# Altium footprint library Footprints.PcbLib: 135 footprints (part 3 of 9)
Each footprint in its own frame and in the unit in brackets; x right, y up, seen from the top. Pads: shape width x height; smd on the part's side, far side on the other; paste and mask are expansions set on the pad; w line width, h text height; cw(c..) or ccw(c..) is an arc to the next point about the centre after c.
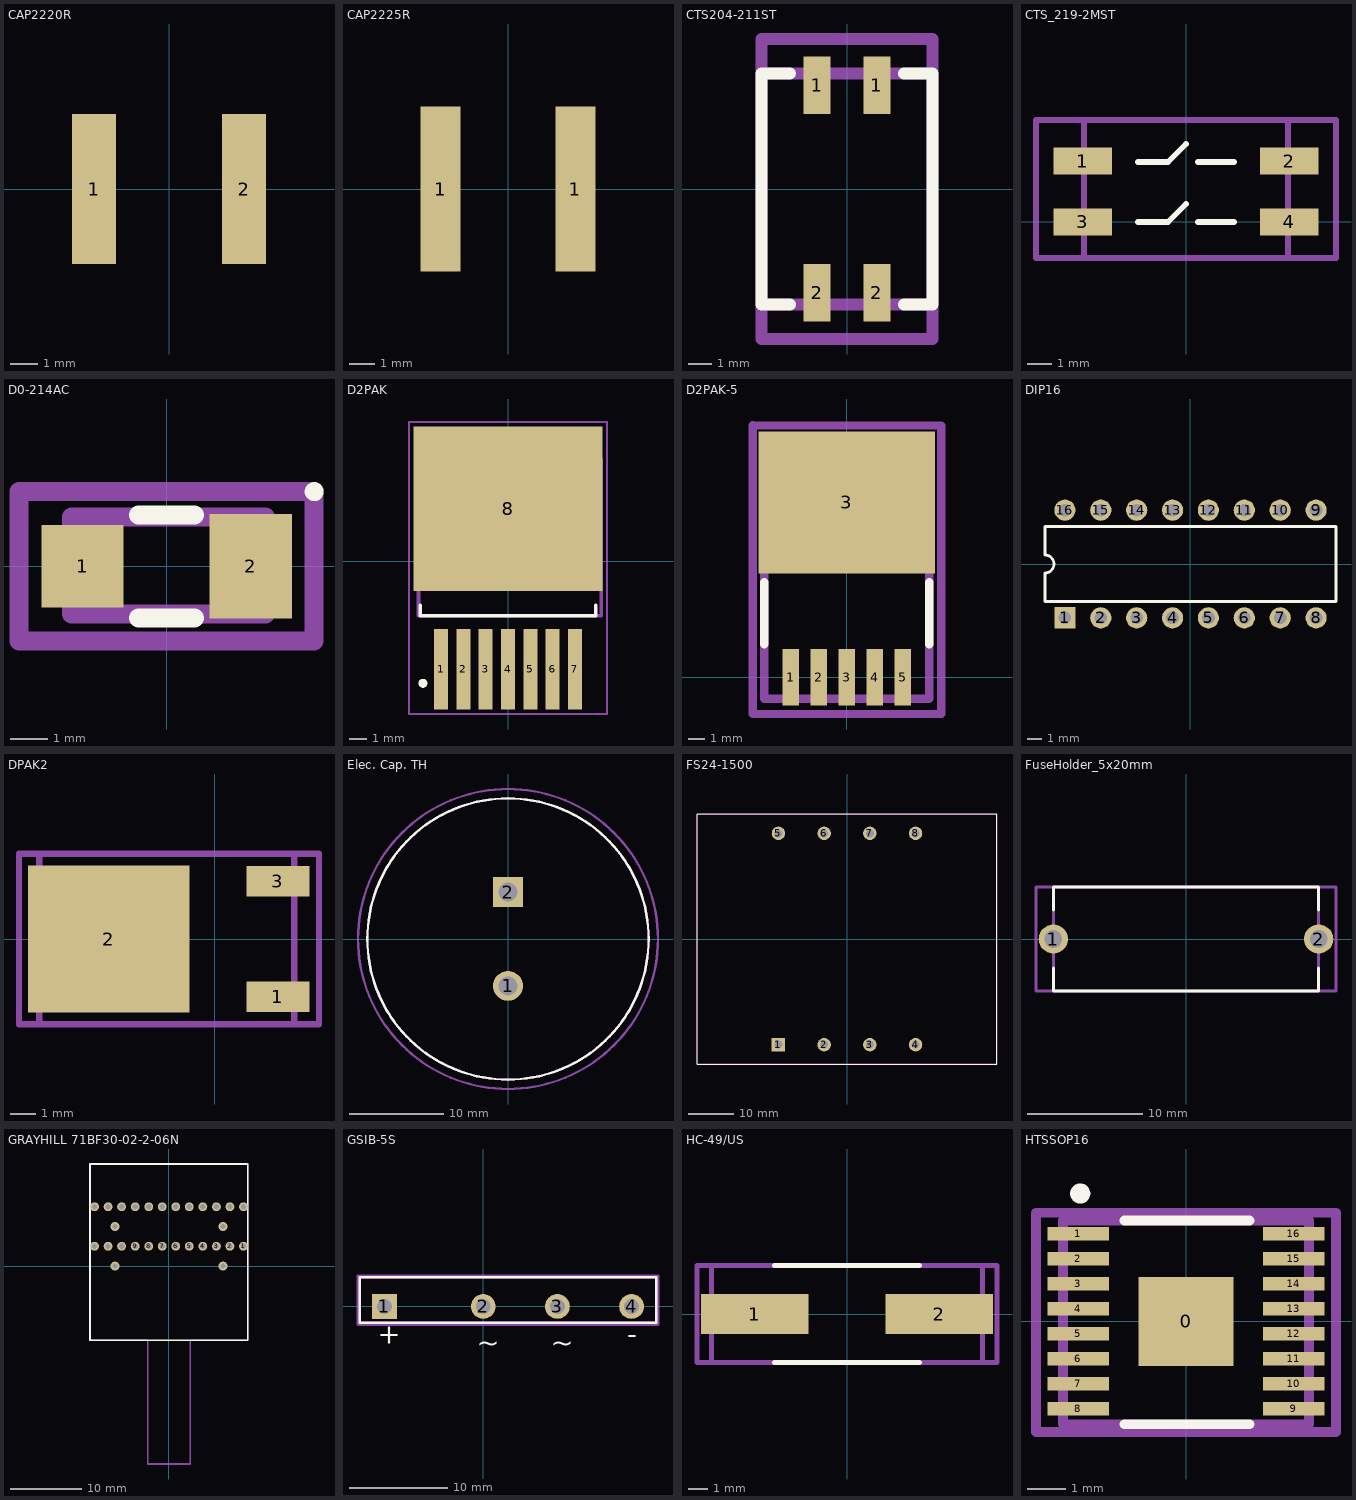
[diagram p2: the footprints below, top view; thin cyan lines are the x and y axes]

## CAP2220R [mm] "capacitor 2220 reflow soldering"
pads (2):
  rect 1.6x5.4 smd: 1(-2.7,0) 2(2.7,0)
3D body: height 2.24, standoff -0.04, extent -2.85,-2.5 2.85,2.5

## CAP2225R [mm] "capacitor 2225 reflow soldering"
pads (2):
  rect 1.6x6.6 smd: 1(-2.7,0) 1(2.7,0)
3D body: height 1.44, standoff -0.04, extent -2.85,-3.175 2.87,3.175

## CTS204-211ST [mm] "SPST DIP Switch"
height 7.6
pads (4):
  rect 1.13x2.435 smd mask+0.102: 1(-1.27,4.401) 1(1.27,4.401) 2(-1.27,-4.401) 2(1.27,-4.401)
Top Overlay:
  lines w0.508: -2.413,-4.89 -3.63,-4.89 -3.63,4.89 -2.413,4.89 ; 2.413,-4.89 3.63,-4.89 3.63,4.89 2.413,4.89
Mechanical 13:
  lines w0.508: -3.63,-4.89 3.63,-4.89 3.63,4.89 -3.63,4.89 -3.63,-4.89
Mechanical 15:
  lines w0.508: -3.63,-6.357 3.63,-6.357 3.63,6.357 -3.63,6.357 -3.63,-6.357
3D body: height 10.14, standoff 0, extent -3.63,-5.207 3.63,5.193

## CTS_219-2MST [mm] "2 Pos Microswitch"
height 3.8
pads (4):
  rect 2.44x1.13 smd mask+0.102: 1(-4.3,2.54) 2(4.3,2.54) 3(-4.3,0) 4(4.3,0)
Top Overlay:
  lines w0.254: -2,0 -0.75,0 0,0.75 ; -2,2.5 -1.25,2.5 -0.75,2.5 0,3.25 ; 0.5,0 2,0 ; 0.5,2.5 2,2.5
Mechanical 13:
  lines w0.254: -4.25,-1.5 -4.25,4.25 4.25,4.25 4.25,-1.5 -4.25,-1.5
Mechanical 15:
  lines w0.254: -6.25,-1.5 -6.25,4.25 6.25,4.25 6.25,-1.5 -6.25,-1.5
3D body: height 3.8, standoff 0, extent -4.25,-1.5 4.25,4.25
3D body: height 3.9, standoff 0, extent -1.25,2 1.25,3
3D body: height 3.9, standoff 0, extent -1.25,-0.5 1.25,0.5
3D body: height 0.5, standoff 0, extent -5,2 -4.25,3
3D body: height 0.5, standoff 0, extent -5,-0.5 -4.25,0.5
3D body: height 0.5, standoff 0, extent 4.25,-0.5 5,0.5
3D body: height 0.5, standoff 0, extent 4.25,2 5,3

## D0-214AC [mm]
height 2.3
pads (2):
  rect 2.2x2.21 smd mask+0.102: 1(-2.25,0)
  rect 2.2x2.8 smd mask+0.102: 2(2.25,0)
Top Overlay:
  circle w0.254: c3.95,2 r0.127
  lines w0.508: -0.75,-1.375 0.75,-1.375 ; -0.75,1.375 0.75,1.375
Mechanical 13:
  lines w0.508: -2.55,-1.275 -2.55,1.325 2.65,1.325 2.65,-1.275 -2.55,-1.275
Mechanical 15:
  lines w0.508: -3.95,-2 3.95,-2 3.95,2 -3.95,2 -3.95,-2
3D body: height 1, standoff -1.4, extent -2.55,-1.275 2.65,1.325

## D2PAK [mm] "T0-263AC-7"
height 12.7
pads (8):
  rect 0.8x4.6 smd: 1(-3.81,-6.15) 2(-2.54,-6.15) 3(-1.27,-6.15) 4(0,-6.15) 5(1.27,-6.15) 6(2.54,-6.15) 7(3.81,-6.15)
  rect 10.8x9.4 smd paste-10.492: 8(0,3)
Top Overlay:
  circle w0.254: c-4.85,-6.95 r0.127
  lines w0.203: -5,-2.5 -5,-3.099 5,-3.099 5,-2.5
Top Paste:
  rectangle: -1.6,-1.6 1.6,0.1
  rectangle: 2.4,-1.6 5.3,0.1
  rectangle: -5.3,-1.6 -2.4,0.1
  rectangle: -5.3,0.9 -2.4,2.6
  rectangle: 2.4,0.9 5.3,2.6
  rectangle: -1.6,0.9 1.6,2.6
  rectangle: -5.3,5.9 -2.4,7.6
  rectangle: 2.4,5.9 5.3,7.6
  rectangle: -1.6,5.9 1.6,7.6
  rectangle: -1.6,3.4 1.6,5.1
  rectangle: 2.4,3.4 5.3,5.1
  rectangle: -5.3,3.4 -2.4,5.1
Mechanical 13:
  lines w0.203: -5.1,-3.099 5.309,-3.099 5.309,5.817 -5.1,5.817 -5.1,-3.099
Mechanical 15:
  lines w0.102: -0.508,0 0.508,0 ; 0,-0.508 0,0.508 ; -5.65,-8.7 5.65,-8.7 5.65,7.95 -5.65,7.95 -5.65,-8.7
3D body: height 4.53, standoff 0.03, extent -5.08,-7.807 5.135,7.299

## D2PAK-5 [mm]
height 4.83
pads (6):
  rect 1x3.4 smd mask+0.102: 1(-3.4,0) 2(-1.7,0) 3(0,0) 4(1.7,0) 5(3.4,0)
  rect 10.7x8.6 smd mask+0.102: 3(0,10.6)
Top Overlay:
  lines w0.508: -5,2 -5,5.75 ; 5,2 5,5.75
Mechanical 13:
  lines w0.508: -5,14.375 -5,-1.3 5,-1.3 5,14.4 -5,14.4
Mechanical 15:
  lines w0.508: -5.7,15.275 -5.7,-2.225 5.725,-2.225 5.725,15.25 -5.675,15.25
3D body: height 4.78, standoff -0.02, extent -5,-1.29 5,14.38

## DIP16 [mm] "DIP; 16 Leads; Row Spacing 7.62 mm; Pitch 2.54 mm"
height 5.08
pads (16):
  rect 1.5x1.5 hole 0.9: 1(-8.89,-3.81)
  round 1.5 hole 0.9: 2(-6.35,-3.81) 3(-3.81,-3.81) 4(-1.27,-3.81) 5(1.27,-3.81) 6(3.81,-3.81) 7(6.35,-3.81) 8(8.89,-3.81) 9(8.89,3.81) 10(6.35,3.81) 11(3.81,3.81) 12(1.27,3.81) 13(-1.27,3.81) 14(-3.81,3.81) 15(-6.35,3.81) 16(-8.89,3.81)
Top Overlay:
  lines w0.2: -10.3,-2.65 -10.3,-0.635 ccw(c-10.3,0) -10.3,0.635 -10.3,2.65 10.3,2.65 10.3,-2.65 -10.3,-2.65
3D body: height 5.08, standoff -2.49, extent -10,-3.935 10,3.935

## DPAK2 [mm]
height 2.3
pads (3):
  rect 2.5x1.2 smd mask+0.102: 1(2.5,-2.28) 3(2.5,2.28)
  rect 6.4x5.8 smd mask+0.102: 2(-4.2,0)
Mechanical 13:
  lines w0.254: -6.95,-3.375 3.15,-3.375 3.15,3.375 -6.95,3.375 -6.95,-3.375
Mechanical 15:
  lines w0.254: -7.75,-3.375 -7.75,3.375 4.125,3.375 4.125,-3.375 -7.75,-3.375
3D body: height 2.37, standoff -0.03, extent -6.95,-3.367 3.15,3.367

## Elec. Cap. TH [mm] "THrough-hole (D=30mm, L=25mm, LS=10mm)"
pads (2):
  round 3.2 hole 2 mask+0.102: 1(0,-5)
  rect 3.2x3.2 hole 2 mask+0.102: 2(0,5)
Top Overlay:
  circle w0.254: c0,0 r15
Mechanical 13:
  circle w0.254: c0,0 r15
Mechanical 15:
  circle w0.254: c0,0 r16
3D body: height 17, standoff 0, extent -14.882,-14.97 15,14.971

## FS24-1500 [mm] "115:115 - 24:24 xfrmr"
height 39.776
pads (8):
  rect 3x3 hole 1.8 mask+0.102: 1(-15.24,-23.5)
  round 3 hole 1.8 mask+0.102: 2(-5.08,-23.5) 3(5.08,-23.5) 4(15.24,-23.5) 5(-15.24,23.5) 6(-5.08,23.5) 7(5.08,23.5) 8(15.24,23.5)
Top Overlay:
  lines w0.254: -33.35,27.775 -33.35,-27.8 33.35,-27.8 33.35,27.8 -33.35,27.8
Mechanical 13:
  lines w0.254: -33.35,-27.788 -33.35,27.788 33.35,27.788 33.35,-27.788 -33.35,-27.788
3D body: height 39.67, standoff 0, extent -17.5,-23.5 17.5,23.5
3D body: height 25.4, standoff 12.7, extent -33.325,-27.825 33.325,27.8
3D body: height 2, standoff -4, extent -16.273,22.461 -14.198,24.539
3D body: height 2, standoff -4, extent -6.113,22.461 -4.038,24.539
3D body: height 2, standoff -4, extent 4.047,22.461 6.122,24.539
3D body: height 2, standoff -4, extent 14.207,22.461 16.282,24.539
3D body: height 2, standoff -4, extent -16.273,-24.539 -14.198,-22.461
3D body: height 2, standoff -4, extent -6.113,-24.539 -4.038,-22.461
3D body: height 2, standoff -4, extent 4.047,-24.539 6.122,-22.461
3D body: height 2, standoff -4, extent 14.207,-24.539 16.282,-22.461

## FuseHolder_5x20mm [mm]
height 12.7
pads (2):
  round 2.54 hole 1.524 mask+0.102: 1(-11.5,0) 2(11.5,0)
Top Overlay:
  lines w0.254: -11.5,-2.5 -11.5,-4.5 11.5,-4.5 11.5,-2.5 ; -11.5,2.5 -11.5,4.5 11.5,4.5 11.5,2.5
Mechanical 13:
  lines w0.254: -11.5,-4.5 -11.5,4.5 11.5,4.5 11.5,-4.5 -11.5,-4.5
Mechanical 15:
  lines w0.254: -13,-4.5 -13,4.5 13,4.5 13,-4.5 -13,-4.5
3D body: height 13.44, standoff -5.4, extent -11.64,-4.5 11.52,4.5

## GRAYHILL 71BF30-02-2-06N [mm] "Two deck, DP6T Rotary Switch"
height 16.5
pads (28):
  round 1.25 hole 0.75 mask+0.102: 1(10.51,2.79) 2(8.6,2.79) 3(6.69,2.79) 4(4.78,2.79) 5(2.87,2.79) 6(0.96,2.79) 7(-0.95,2.79) 8(-2.86,2.79) 9(-4.77,2.79) 10(-6.68,2.79) 11(-8.59,2.79) 12(-10.5,2.79) 13(10.51,8.37) 14(8.6,8.37) 15(6.69,8.37) 16(4.78,8.37) 17(2.87,8.37) 18(0.96,8.37) 19(-0.95,8.37) 20(-2.86,8.37) 21(-4.77,8.37) 22(-6.68,8.37) 23(-8.59,8.37) 24(-10.5,8.37) 25(7.625,0) 26(7.625,5.58) 27(-7.615,0) 28(-7.615,5.58)
Top Overlay:
  lines w0.254: -11.125,-10.475 -11.125,14.4 11.125,14.4 11.125,-10.475 3,-10.475 -11.125,-10.475
Mechanical 13:
  lines w0.254: -3.025,-10.475 -11.125,-10.475 -11.125,14.4 11.125,14.4 11.125,-10.475 3,-10.475 3,-27.925 -3,-27.925 -3,-10.475
Mechanical 15:
  lines w0.254: -11.125,-10.475 -11.125,14.4 11.125,14.4 11.125,-10.475 3,-10.475 3,-27.925 -3,-27.925 -3,-10.475 -11.125,-10.475
3D body: height 16.5, standoff 0, extent -11.125,-27.925 11.15,14.425

## GSIB-5S [mm] "Bridge Rectifier"
height 20
pads (4):
  rect 2.5x2.5 hole 1.5 mask+0.102: 1(-10,0)
  round 2.5 hole 1.5 mask+0.102: 2(0,0) 3(7.5,0) 4(15,0)
Top Overlay:
  lines w0.254: -12.5,-1.65 -12.5,2.95 17.5,2.95 17.5,-1.65 -12.5,-1.65
  text "~" at 6.825,-4.65 h2.03
  text "~" at -0.675,-4.65 h2.03
  text "-" at 14.575,-3.775 h2.03
  text "+" at -10.675,-3.775 h2.03
Mechanical 13:
  lines w0.254: -12.5,-1.65 17.5,-1.65 17.5,2.95 -12.5,2.95 -12.5,-1.65
Mechanical 15:
  lines w0.254: -12.675,-1.825 17.675,-1.825 17.675,3.125 -12.675,3.125 -12.675,-1.825
3D body: height 20, standoff 1, extent -12.5,-1.65 17.5,2.95
3D body: height 1, standoff -4, extent -10.496,-0.499 -9.5,0.499
3D body: height 1, standoff -4, extent -0.496,-0.499 0.5,0.499
3D body: height 1, standoff -4, extent 14.504,-0.499 15.5,0.499
3D body: height 1, standoff -4, extent 7.004,-0.499 8,0.499

## HC-49/US [mm] "Crystal"
height 4.5
pads (2):
  rect 5.55x2.05 smd mask+0.102: 1(-4.775,0) 2(4.775,0)
Top Overlay:
  lines w0.254: -3.75,-2.5 3.75,-2.5 ; -3.75,2.5 3.75,2.5
Mechanical 13:
  lines w0.254: -7,-2.5 -7,2.5 7,2.5 7,-2.5 -7,-2.5
Mechanical 15:
  lines w0.254: -7.75,-2.5 -7.75,2.5 7.75,2.5 7.75,-2.5 -7.75,-2.5
3D body: height 4.5, standoff -0.01, extent -6.95,-2.5 6.95,2.5

## HTSSOP16 [mm] "0.65mm Pitch"
height 1.2
pads (17):
  rect 2.46x2.31 smd mask+0.102: 0(0,0)
  rect 1.6x0.35 smd mask+0.102: 1(-2.8,2.275) 2(-2.8,1.625) 3(-2.8,0.975) 4(-2.8,0.325) 5(-2.8,-0.325) 6(-2.8,-0.975) 7(-2.8,-1.625) 8(-2.8,-2.275) 9(2.8,-2.275) 10(2.8,-1.625) 11(2.8,-0.975) 12(2.8,-0.325) 13(2.8,0.325) 14(2.8,0.975) 15(2.8,1.625) 16(2.8,2.275)
Top Overlay:
  circle w0.254: c-2.75,3.325 r0.135
  lines w0.254: -1.6,-2.675 1.65,-2.675 ; -1.6,2.625 1.65,2.625
Mechanical 13:
  lines w0.254: -3.2,-2.675 -3.2,2.625 3.2,2.625 3.2,-2.675 -3.2,-2.675
Mechanical 15:
  lines w0.254: -3.9,-2.875 -3.9,2.825 3.9,2.825 3.9,-2.875 -3.9,-2.875
3D body: height 1.09, standoff 0, extent -3.058,-2.5 3.222,2.5